# Altium footprint library laihi.PcbLib: 222 footprints (part 10 of 14)
Each footprint in its own frame and in the unit in brackets; x right, y up, seen from the top. Pads: shape width x height; smd on the part's side, far side on the other; paste and mask are expansions set on the pad; w line width, h text height; cw(c..) or ccw(c..) is an arc to the next point about the centre after c.
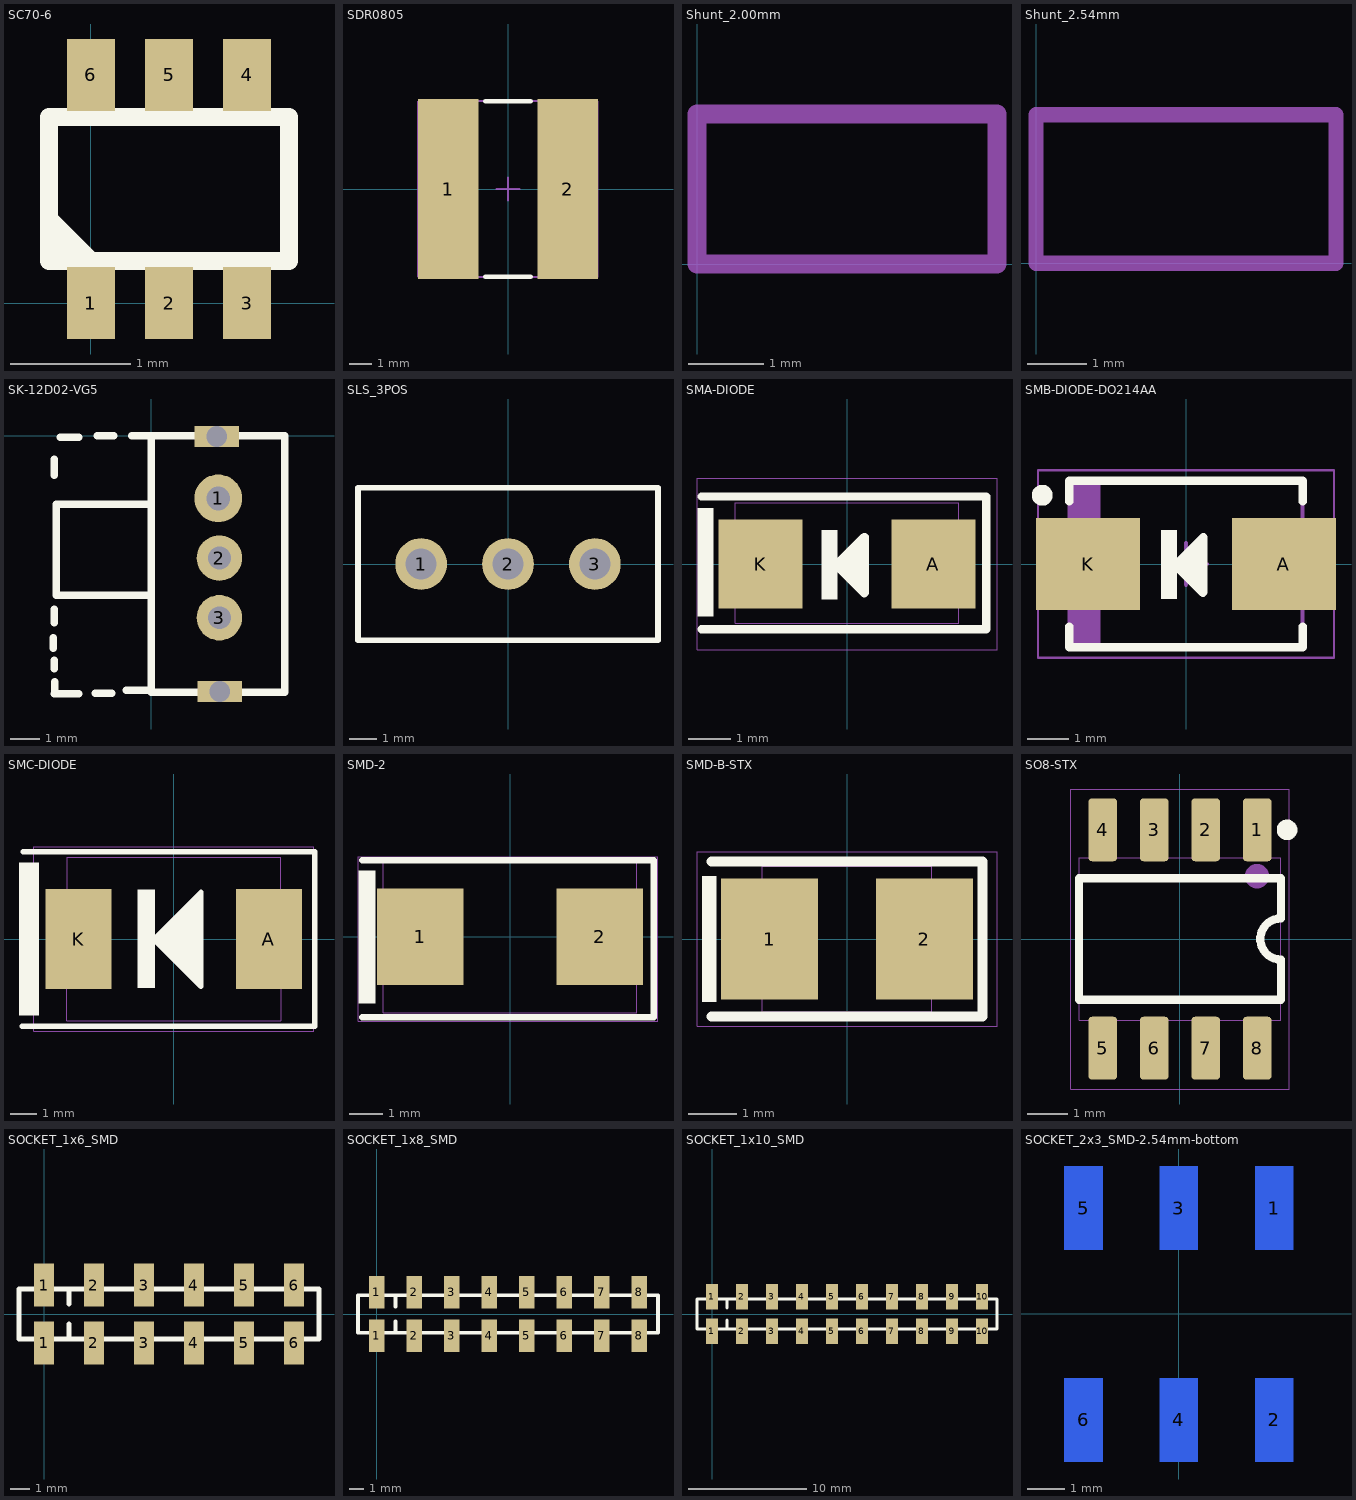
[diagram p9: the footprints below, top view; thin cyan lines are the x and y axes]

## SC70-6 [mm]
pads (6):
  rect 0.4x0.6 smd: 1(0,0) 2(0.65,0) 3(1.3,0) 4(1.3,1.9) 5(0.65,1.9) 6(0,1.9)
Top Overlay:
  lines w0.1: 0,0.35 0,0.35
  lines w0.15: -0.35,0.6 -0.1,0.35 ; -0.35,0.7 0,0.35 ; -0.35,0.35 1.65,0.35 1.65,1.55 -0.35,1.55 -0.35,0.35
3D body "User Library-SC70-6.step": height 0.92, standoff -0.03, extent -0.35,-0.1 1.65,2

## SDR0805 [mm] "SDR0805 Series - SMD Power Inductors BOURNS"
height 5.3
pads (2):
  rect 2.7x8 smd: 1(-2.65,0) 2(2.65,0)
Top Overlay:
  lines w0.2: -1,-3.9 1,-3.9 ; -1,3.9 1,3.9
Mechanical 13:
  lines w0.1: -3.9,-3.9 3.9,-3.9 3.9,3.9 -3.9,3.9 -3.9,-3.9
Mechanical 15:
  lines w0.05: -4,-3.9 4,-3.9 4,3.9 -4,3.9 -4,-3.9
  lines w0.1: -0.5,0 0.5,0 ; 0,-0.5 0,0.5
3D body: height 5.3, standoff 0, extent 1.6,-3.9 3.9,3.9
3D body: height 5.3, standoff 0, extent -3.9,-3.9 -1.6,3.9
3D body: height 5.3, standoff 0, extent -1.6,-3.9 1.6,3.9

## Shunt_2.00mm [mm]
Mechanical 3:
  lines w0.254: 0,0 0,2 4,2 4,0 0,0
3D body "jumper_akso-200_z.stp": height 6.04, standoff 2.54, extent 0.05,0.05 3.95,1.95

## Shunt_2.54mm [mm]
Mechanical 3:
  lines w0.254: 0,0 0,2.489 5.029,2.489 5.029,0 0,0
3D body "User Library-Control System_FCI_68786-102LF.STEP": height 7.62, standoff 2.54, extent 0,0 5.029,2.489

## SK-12D02-VG5 [mm]
height 7.5
pads (5):
  round 1.6 hole 0.8: 1(2.25,-2.1)
  round 1.524 hole 0.762: 2(2.288,-4.1) 3(2.288,-6.1)
  rect 1.5x0.7 hole 0.7 square: ""(2.2,-0.025) ""(2.3,-8.575)
Top Overlay:
  lines w0.254: -3.275,-7.125 -3.275,-6.775 ; -3.25,-8.65 -2.425,-8.65 ; -3.25,-7.8 -3.25,-7.525 ; -3.25,-6.275 -3.25,-5.825 ; -3.25,-1.325 -3.25,-0.8 ; -3.225,-8.625 -3.225,-8.25 ; -3.05,-0.05 -2.425,-0.05 ; -1.875,-8.625 -1.325,-8.625 ; -1.8,0 -1.25,0 ; -0.825,-8.525 -0.075,-8.525 ; -0.65,0 0,0 ; -0.05,-5.35 -3.175,-5.35 -3.175,-2.3 -0.05,-2.3 ; 0,0 4.475,0 4.475,-8.6 0,-8.6 0,0

## SLS_3POS [mil]
height 400
pads (3):
  round 75 hole 45: 1(-126,0) 2(0,0) 3(126,0)
Top Overlay:
  lines w8: -217.52,-110.24 -217.52,110.24 217.52,110.24 217.52,-110.24 -217.52,-110.24
Mechanical 13:
  circle w1: c-126,0 r22.4
  circle w1: c0,0 r22.96
  circle w1: c126,0 r22.67
  lines w1: -217.52,-110.24 217.52,-110.24 217.52,110.24 -217.52,110.24 -217.52,-110.24
3D body: height 11.81, standoff 0, extent -217.52,-110.24 217.52,109.25

## SMA-DIODE [mm]
pads (2):
  rect 2x2.1 smd: A(2.05,0) K(-2.05,0)
Top Overlay:
  rectangle: -3.55,-1.25 -3.165,1.328
  rectangle: -0.6,-0.84 -0.22,0.81
  region: 0.42,0.64 0.41,-0.69 -0.27,-0.01
  lines w0.2: -3.45,-1.55 3.3,-1.55 3.3,1.6 -3.45,1.6 ; -0.27,-0.01 0.41,-0.69 ; -0.22,0.01 0.41,0.64 ; 0.41,0.63 0.42,0.64 0.42,-0.68
Mechanical 13:
  lines w0.025: -2.85,-0.95 -2.85,0.95 -2.35,0.95 -1.5,0.95 -1.5,-0.95 -2.35,-0.95 -2.85,-0.95 ; -2.65,-1.4 -2.65,1.45 2.65,1.45 2.65,-1.4 -2.65,-1.4 ; 1.5,-0.95 2.35,-0.95 2.85,-0.95 2.85,0.95 2.35,0.95 1.5,0.95 1.5,-0.95
Mechanical 15:
  lines w0.025: -3.556,-2.032 3.556,-2.032 3.556,2.032 -3.556,2.032 -3.556,-2.032
3D body "SMA-DIODE.stp": height 2.44, standoff 0, extent -2.65,-1.4 2.63,1.5

## SMB-DIODE-DO214AA [mm] "2Leads, SMB, JEDEC, DO214 VARIATION AA"
height 2.45
pads (2):
  rect 2.5x2.2 smd: A(2.35,0) K(-2.35,0)
Top Overlay:
  circle w0.25: c-3.45,1.65 r0.125
  rectangle: -0.6,-0.84 -0.22,0.81
  region: 0.42,0.64 0.41,-0.69 -0.27,-0.01
  lines w0.2: -2.8,-1.5 -2.8,-2 2.8,-2 2.8,-1.5 ; -2.8,1.5 -2.8,2 2.8,2 2.8,1.5 ; -0.27,-0.01 0.41,-0.69 ; -0.22,0.01 0.41,0.64 ; 0.42,-0.68 0.42,0.64
Mechanical 13:
  rectangle: -2.8,-1.975 -2.047,1.975
  lines w0.1: -2.8,-1.975 -2.8,1.975 2.8,1.975 2.8,-1.975 -2.8,-1.975
Mechanical 15:
  lines w0.05: -3.55,-2.25 -3.55,2.25 3.55,2.25 3.55,-2.25 -3.55,-2.25
  lines w0.1: -0.5,0 0.5,0 ; 0,-0.5 0,0.5
3D body "SMB-DIODE-DO214AA.step": height 2.45, standoff 0, extent -3.02,-1.975 3.02,1.975

## SMC-DIODE [mm]
pads (2):
  rect 2.5x3.8 smd: A(3.6,0) K(-3.6,0)
Top Overlay:
  rectangle: -1.37,-1.85 -0.72,1.87
  rectangle: -5.862,-2.9 -5.1,2.9
  region: -0.79,0.02 1.03,1.77 1.03,-1.8
  lines w0.2: -5.75,-3.3 5.334,-3.3 5.334,3.3 -5.7,3.3 ; -0.79,0.02 -0.72,0.02 1.03,1.77 1.03,-1.8 -0.75,-0.02
Mechanical 13:
  lines w0.025: 4.05,-1.5 4.05,-3.1 -4.05,-3.1 -4.05,-1.5 ; 4.05,1.5 4.05,3.1 -4.05,3.1 -4.05,1.5 ; -4.05,-1.5 -4.35,-1.5 -4.35,1.5 -4.05,1.5 ; -4.05,-1.5 -3.55,-1.5 -2.75,-1.5 -2.75,1.5 -3.55,1.5 -4.05,1.5 ; 2.7,-1.5 2.7,1.5 3.55,1.5 4.35,1.5 4.35,-1.5 3.55,-1.5 2.7,-1.5
Mechanical 15:
  lines w0.025: -5.3,-3.5 5.3,-3.5 5.3,3.5 -5.3,3.5 -5.3,-3.5
3D body "SMC-DIODE.stp": height 2.62, standoff 0, extent -4.05,-3.1 4.08,3.13

## SMD-2 [mm] "SMD power resistor 2W"
height 3.6
pads (2):
  rect 2.6x2.9 smd: 1(-2.7,0) 2(2.7,0)
Top Overlay:
  rectangle: -4.55,-2 -4.05,2
  lines w0.2: -4.445,-2.416 4.319,-2.416 4.319,2.305 -4.445,2.305
Mechanical 13:
  lines w0.025: -3.81,-1.27 -3.683,-1.27 -3.683,1.27 -3.81,1.27 ; 3.81,-1.27 3.683,-1.27 3.683,1.27 3.81,1.27 ; -3.81,-2.286 -3.81,2.286 3.81,2.286 3.81,-2.286 -3.81,-2.286
Mechanical 15:
  lines w0.025: -4.572,-2.54 -4.572,2.413 4.445,2.413 4.445,-2.54 -4.572,-2.54
3D body: height 0, standoff 0, extent -3.81,-2.286 3.81,2.286
3D body "CAP-CASE-D.stp": height 3.1, standoff 0, extent -3.826,-2.265 3.674,2.235

## SMD-B-STX [mm]
pads (2):
  rect 2x2.5 smd: 1(-1.6,0) 2(1.6,0)
Top Overlay:
  rectangle: -3,-1.3 -2.7,1.3
  lines w0.2: -2.8,-1.6 2.8,-1.6 2.8,1.6 -2.8,1.6
Mechanical 13:
  lines w0.025: -1.75,1.15 -1.55,1.15 -1.55,-1.15 -1.74,-1.15 ; 1.74,-1.15 1.55,-1.15 1.55,1.15 1.75,1.15 ; -1.75,-1.5 -1.75,1.5 1.75,1.5 1.75,-1.5 -1.75,-1.5
Mechanical 15:
  lines w0.025: -3.1,-1.8 -3.1,1.8 3.1,1.8 3.1,-1.8 -3.1,-1.8
3D body "CAP-CASE-B.stp": height 2.1, standoff 0, extent -1.85,-1.5 1.85,1.5

## SO8-STX [mil]
height 69.02
pads (8):
  rrect25% 28x61 smd mask+5: 1(75,106) 2(25,106) 3(-25,106) 4(-75,106) 5(-75,-106) 6(-25,-106) 7(25,-106) 8(75,-106)
Top Overlay:
  circle w10: c104,106 r5
  lines w8: -98,-59.06 98,-59.06 98,-20 cw(c98,0) 98,20 98,59.06 -98,59.06 -98,-59.06
Mechanical 13:
  circle w19.68: c74.8,61.02 r1.97
  lines w1: -84.5,-79 -84.5,-89 ; -84.5,79 -84.5,89 ; -65.5,-79 -65.5,-89 ; -65.5,79 -65.5,89 ; -34.5,-79 -34.5,-89 ; -34.5,79 -34.5,89 ; -15.5,-79 -15.5,-89 ; -15.5,79 -15.5,89 ; 15.5,-79 15.5,-89 ; 15.5,79 15.5,89 ; 34.5,-79 34.5,-89 ; 34.5,79 34.5,89 ; 65.5,-79 65.5,-89 ; 65.5,79 65.5,89 ; 84.5,-79 84.5,-89 ; 84.5,79 84.5,89 ; -84.5,-99 -84.5,-89 ; -84.5,-99 -65.5,-99 ; -84.5,-99 -84.5,-122 -65.5,-122 -65.5,-99 ; -84.5,-89 -65.5,-89 ; -84.5,89 -84.5,99 ; -84.5,89 -65.5,89 ; -84.5,99 -65.5,99 ; -84.5,99 -84.5,122 -65.5,122 -65.5,99 ; -65.5,-99 -65.5,-89 ; -65.5,89 -65.5,99 ; -34.5,-99 -34.5,-89 ; -34.5,-99 -15.5,-99 ; -34.5,-99 -34.5,-122 -15.5,-122 -15.5,-99 ; -34.5,-89 -15.5,-89 ; -34.5,89 -34.5,99 ; -34.5,89 -15.5,89 ; -34.5,99 -15.5,99 ; -34.5,99 -34.5,122 -15.5,122 -15.5,99 ; -15.5,-99 -15.5,-89 ; -15.5,89 -15.5,99 ; 15.5,-99 15.5,-89 ; 15.5,-99 34.5,-99 ; 15.5,-99 15.5,-122 34.5,-122 34.5,-99 ; 15.5,-89 34.5,-89 ; 15.5,89 15.5,99 ; 15.5,89 34.5,89 ; 15.5,99 34.5,99 ; 15.5,99 15.5,122 34.5,122 34.5,99 ; 34.5,-99 34.5,-89 ; 34.5,89 34.5,99 ; 65.5,-99 65.5,-122 84.5,-122 84.5,-99 ; 65.5,-99 84.5,-99 ; 65.5,-99 65.5,-89 ; 65.5,-89 84.5,-89 ; 65.5,89 65.5,99 ; 65.5,89 84.5,89 ; 65.5,99 84.5,99 ; 65.5,99 65.5,122 84.5,122 84.5,99 ; 84.5,-99 84.5,-89 ; 84.5,89 84.5,99 ; -98,-78.74 -98,78.74 98,78.74 98,-78.74 -98,-78.74
Mechanical 15:
  lines w0.98: -106.3,-145.67 -106.3,145.67 106.3,145.67 106.3,-145.67 -106.3,-145.67
3D body "SOIC8.stp": height 68.9, standoff 0, extent -96.85,-122.05 96.85,122.04

## SOCKET_1x6_SMD [mm] "Socket, 2.54mm, SMD"
height 9.5
pads (12):
  rect 1.02x2.19 smd: 1(0,-1.465) 1(0,1.465) 2(2.54,-1.465) 2(2.54,1.465) 3(5.08,-1.465) 3(5.08,1.465) 4(7.62,-1.465) 4(7.62,1.465) 5(10.16,-1.465) 5(10.16,1.465) 6(12.7,1.465) 6(12.7,-1.465)
Top Overlay:
  lines w0.254: 1.27,-1.27 1.27,-0.508 ; 1.27,0.508 1.27,1.27 ; -1.27,-1.27 13.97,-1.27 13.97,1.27 -1.27,1.27 -1.27,-1.27
3D body "Samtec-SSM-106-L-SV.step": height 7.47, standoff -0.03, extent -1.27,-2.286 13.97,2.286

## SOCKET_1x8_SMD [mm] "Socket, 2.54mm, SMD"
height 9.5
pads (16):
  rect 1.02x2.19 smd: 1(0,-1.465) 1(0,1.465) 2(2.54,-1.465) 2(2.54,1.465) 3(5.08,-1.465) 3(5.08,1.465) 4(7.62,-1.465) 4(7.62,1.465) 5(10.16,-1.465) 5(10.16,1.465) 6(12.7,1.465) 6(12.7,-1.465) 7(15.24,-1.465) 7(15.24,1.465) 8(17.78,-1.465) 8(17.78,1.465)
Top Overlay:
  lines w0.254: 1.27,-1.27 1.27,-0.508 ; 1.27,0.508 1.27,1.27 ; -1.27,-1.27 19.05,-1.27 19.05,1.27 -1.27,1.27 -1.27,-1.27
3D body "Samtec-SSM-108-L-SV.step": height 7.47, standoff -0.03, extent -1.27,-2.286 19.05,2.286

## SOCKET_1x10_SMD [mm] "Socket, 2.54mm, SMD"
height 9.5
pads (20):
  rect 1.02x2.19 smd: 1(0,-1.465) 1(0,1.465) 2(2.54,-1.465) 2(2.54,1.465) 3(5.08,-1.465) 3(5.08,1.465) 4(7.62,-1.465) 4(7.62,1.465) 5(10.16,-1.465) 5(10.16,1.465) 6(12.7,-1.465) 6(12.7,1.465) 7(15.24,-1.465) 7(15.24,1.465) 8(17.78,-1.465) 8(17.78,1.465) 9(20.32,-1.465) 9(20.32,1.465) 10(22.86,-1.465) 10(22.86,1.465)
Top Overlay:
  lines w0.254: 1.27,-1.27 1.27,-0.508 ; 1.27,0.508 1.27,1.27 ; -1.27,-1.27 24.13,-1.27 24.13,1.27 -1.27,1.27 -1.27,-1.27
3D body "Samtec-SSM-110-L-SV.step": height 7.47, standoff -0.03, extent -1.27,-2.286 24.13,2.286

## SOCKET_2x3_SMD-2.54mm-bottom [mm] "Socket, 2.54mm, SMD"
height 9.5
pads (6):
  rect 1.02x2.22 smd far side: 1(2.54,2.825) 2(2.54,-2.825) 3(0,2.825) 4(0,-2.825) 5(-2.54,2.825) 6(-2.54,-2.825)
Bottom Overlay:
  circle w0.508: c3.936,3.48 r0.254
  lines w0.254: -3.33,-2.54 -3.81,-2.54 -3.81,2.54 -3.33,2.54 ; -1.77,-2.54 -0.78,-2.54 ; -1.77,2.54 -0.78,2.54 ; 0.78,-2.54 1.77,-2.54 ; 0.78,2.54 1.77,2.54 ; 3.33,-2.54 3.81,-2.54 3.81,2.54 3.33,2.54